# Altium footprint library KNR_Kurs.PcbLib: 250 footprints (part 1 of 16)
Each footprint in its own frame and in the unit in brackets; x right, y up, seen from the top. Pads: shape width x height; smd on the part's side, far side on the other; paste and mask are expansions set on the pad; w line width, h text height; cw(c..) or ccw(c..) is an arc to the next point about the centre after c.
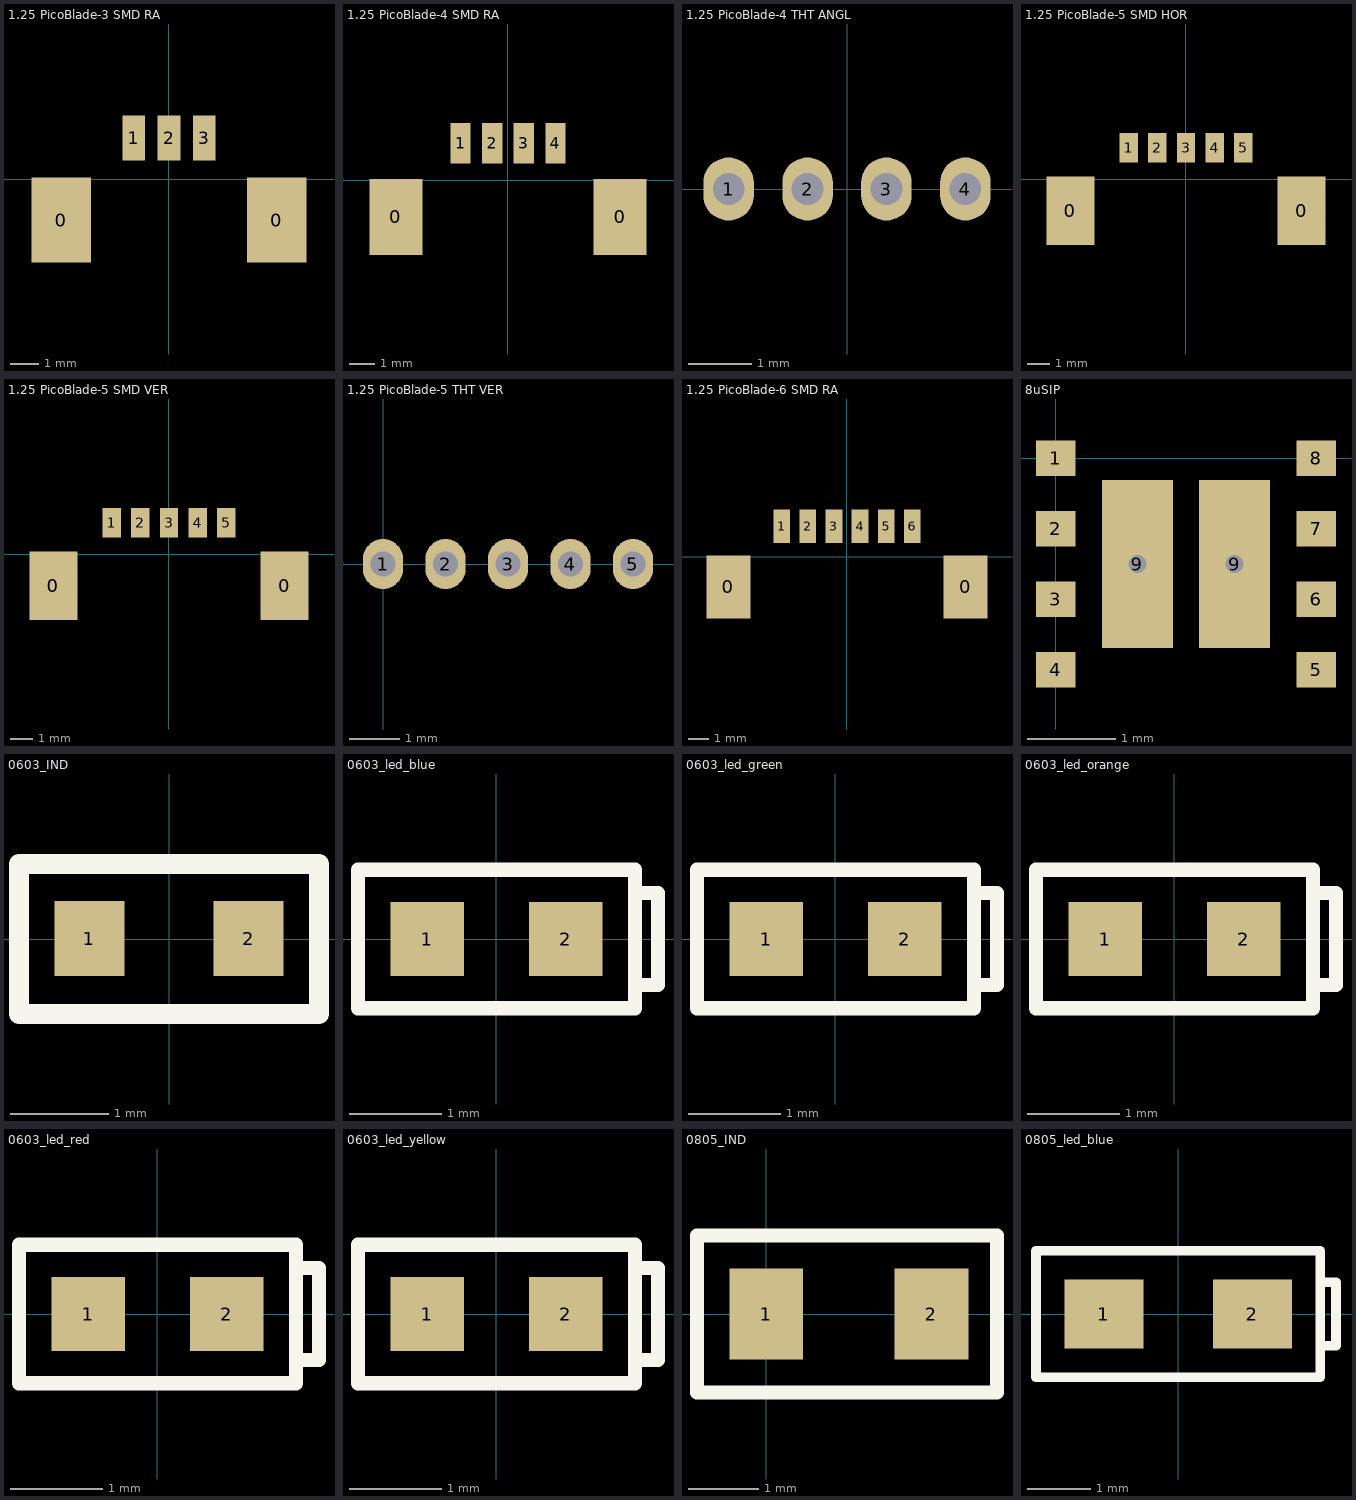
[diagram p0: the footprints below, top view; thin cyan lines are the x and y axes]

## 1.25 PicoBlade-3 SMD RA [mm]
pads (5):
  rect 2.1x3 smd mask+0.07: 0(-3.8,-1.45) 0(3.8,-1.45)
  rect 0.8x1.6 smd mask+0.07: 1(-1.25,1.45) 2(0,1.45) 3(1.25,1.45)
3D body "picoblade3smt.stp": height 3.4, standoff 0, extent -4.45,-3.525 4.45,1.675

## 1.25 PicoBlade-4 SMD RA [mm]
pads (6):
  rect 2.1x3 smd mask+0.07: 0(-4.425,-1.45) 0(4.425,-1.45)
  rect 0.8x1.6 smd mask+0.07: 1(-1.875,1.45) 2(-0.625,1.45) 3(0.625,1.45) 4(1.875,1.45)
3D body "picoblade4smt.stp": height 3.4, standoff 0, extent -5.075,-3.525 5.075,1.675

## 1.25 PicoBlade-4 THT ANGL [mm] "Molex 1.25mm Pitch PicoBlade™ Wire-to-Board Header, Horizontal, with Friction Lock, 4 Circuits"
pads (4):
  oval 0.8x1 hole 0.5 mask+0.07: 1(-1.875,0) 2(-0.625,0) 3(0.625,0) 4(1.875,0)
3D body "picoblade4tht.stp": height 3.48, standoff -2.32, extent -3.375,-1.05 3.375,4.45

## 1.25 PicoBlade-5 SMD HOR [mm] "Molex 1.25mm Pitch PicoBlade™ Header, Surface Mount, Right Angle, 6 Circuits"
pads (7):
  rect 2.1x3 smd mask+0.07: 0(-5.05,-1.375) 0(5.05,-1.375)
  rect 0.8x1.3 smd mask+0.07: 1(-2.5,1.375) 2(-1.25,1.375) 3(0,1.375) 4(1.25,1.375) 5(2.5,1.375)
3D body "picoblade5smt_horiz.stp": height 3.4, standoff 0, extent -5.7,-3.45 5.7,1.75

## 1.25 PicoBlade-5 SMD VER [mm] "Molex 1.25mm Pitch PicoBlade™ Header, Surface Mount, Right Angle, 6 Circuits"
pads (7):
  rect 2.1x3 smd mask+0.07: 0(-5.05,-1.375) 0(5.05,-1.375)
  rect 0.8x1.3 smd mask+0.07: 1(-2.5,1.375) 2(-1.25,1.375) 3(0,1.375) 4(1.25,1.375) 5(2.5,1.375)
3D body "picoblade5smt vertical.stp": height 4.7, standoff 0, extent -5.7,-2.525 5.7,1.675

## 1.25 PicoBlade-5 THT VER [mm] "Molex 1.25mm Pitch PicoBlade™ Wire-to-Board Header, Vertical, with Friction Lock, 5 Circuits"
pads (5):
  oval 0.8x1 hole 0.5 mask+0.07: 1(0,0) 2(1.25,0) 3(2.5,0) 4(3.75,0) 5(5,0)
3D body "molex5pin vert THT.stp": height 4.2, standoff -2.3, extent -1.5,-1.15 6.5,2.05

## 1.25 PicoBlade-6 SMD RA [mm] "Molex 1.25mm Pitch PicoBlade™ Header, Surface Mount, Right Angle, 6 Circuits"
pads (8):
  rect 2.1x3 smd mask+0.07: 0(-5.675,-1.45) 0(5.675,-1.45)
  rect 0.8x1.6 smd mask+0.07: 1(-3.125,1.45) 2(-1.875,1.45) 3(-0.625,1.45) 4(0.625,1.45) 5(1.875,1.45) 6(3.125,1.45)
3D body "picoblade6smt.stp": height 3.4, standoff 0, extent -6.325,-3.525 6.325,1.675

## 8uSIP [mm]
pads (10):
  rect 0.45x0.4 smd mask+0.07: 1(0,0) 2(0,-0.8) 3(0,-1.6) 4(0,-2.4) 5(2.95,-2.4) 6(2.95,-1.6) 7(2.95,-0.8) 8(2.95,0)
  rect 0.8x1.9 smd mask+0.07: 9(0.925,-1.2) 9(2.025,-1.2)
via 0.925,-1.2 diameter 0.55 hole 0.2
via 2.025,-1.2 diameter 0.55 hole 0.2
3D body "User Library-SIL0008E-1.step": height 1.79, standoff -0.01, extent -0.275,-2.95 3.225,0.55

## 0603_IND [mil]
pads (2):
  rect 28x30 smd: 1(-31.89,0.14) 2(31.89,0.14)
Top Overlay:
  lines w7.87: -60,-30 60,-30 60,30 -60,30 -60,-30
3D body "603.stp": height 31.89, standoff 0, extent -31.89,-16 31.89,16.28

## 0603_led_blue [mm]
pads (2):
  rect 0.8x0.8 smd: 1(-0.75,0) 2(0.75,0)
Top Overlay:
  lines w0.152: 1.5,-0.5 1.75,-0.5 1.75,0.5 1.5,0.5 ; -1.5,-0.75 1.5,-0.75 1.5,0.75 -1.5,0.75 -1.5,-0.75
3D body "0603_led_blue.stp": height 0.6, standoff 0, extent -0.8,-0.4 0.8,0.4

## 0603_led_green [mm]
pads (2):
  rect 0.8x0.8 smd: 1(-0.75,0) 2(0.75,0)
Top Overlay:
  lines w0.152: 1.5,-0.5 1.75,-0.5 1.75,0.5 1.5,0.5 ; -1.5,-0.75 1.5,-0.75 1.5,0.75 -1.5,0.75 -1.5,-0.75
3D body "0603_led_green.stp": height 0.6, standoff 0, extent -0.8,-0.4 0.8,0.4

## 0603_led_orange [mm]
pads (2):
  rect 0.8x0.8 smd: 1(-0.75,0) 2(0.75,0)
Top Overlay:
  lines w0.152: 1.5,-0.5 1.75,-0.5 1.75,0.5 1.5,0.5 ; -1.5,-0.75 1.5,-0.75 1.5,0.75 -1.5,0.75 -1.5,-0.75
3D body "0603_led_orange.stp": height 0.6, standoff 0, extent -0.8,-0.4 0.8,0.4

## 0603_led_red [mm]
pads (2):
  rect 0.8x0.8 smd: 1(-0.75,0) 2(0.75,0)
Top Overlay:
  lines w0.152: 1.5,-0.5 1.75,-0.5 1.75,0.5 1.5,0.5 ; -1.5,-0.75 1.5,-0.75 1.5,0.75 -1.5,0.75 -1.5,-0.75
3D body "0603_led_red.stp": height 0.6, standoff 0, extent -0.8,-0.4 0.8,0.4

## 0603_led_yellow [mm]
pads (2):
  rect 0.8x0.8 smd: 1(-0.75,0) 2(0.75,0)
Top Overlay:
  lines w0.152: 1.5,-0.5 1.75,-0.5 1.75,0.5 1.5,0.5 ; -1.5,-0.75 1.5,-0.75 1.5,0.75 -1.5,0.75 -1.5,-0.75
3D body "0603_led_yellow.stp": height 0.6, standoff 0, extent -0.8,-0.4 0.8,0.4

## 0805_IND [mm] "(2012 metric)"
height 0.7
pads (2):
  rect 1.05x1.3 smd: 1(0,0) 2(2.35,0)
Top Overlay:
  lines w0.203: -0.984,-1.118 -0.984,1.118 1.785,1.118 3.283,1.118 3.283,-1.118 1.785,-1.118 -0.984,-1.118
3D body "805.stp": height 0.81, standoff 0, extent 0.152,-0.635 2.172,0.635

## 0805_led_blue [mm]
pads (2):
  rect 1.25x1.1 smd: 1(-1.175,0) 2(1.175,0)
Top Overlay:
  lines w0.152: 2.25,-0.5 2.5,-0.5 2.5,0.5 2.25,0.5 ; -2.25,-1 2.25,-1 2.25,1 -2.25,1 -2.25,-1
3D body "0805_led_blue.stp": height 0.6, standoff 0, extent -1,-0.625 1,0.625